# Altium footprint library IC.PcbLib: 220 footprints (part 1 of 14)
Each footprint in its own frame and in the unit in brackets; x right, y up, seen from the top. Pads: shape width x height; smd on the part's side, far side on the other; paste and mask are expansions set on the pad; w line width, h text height; cw(c..) or ccw(c..) is an arc to the next point about the centre after c.
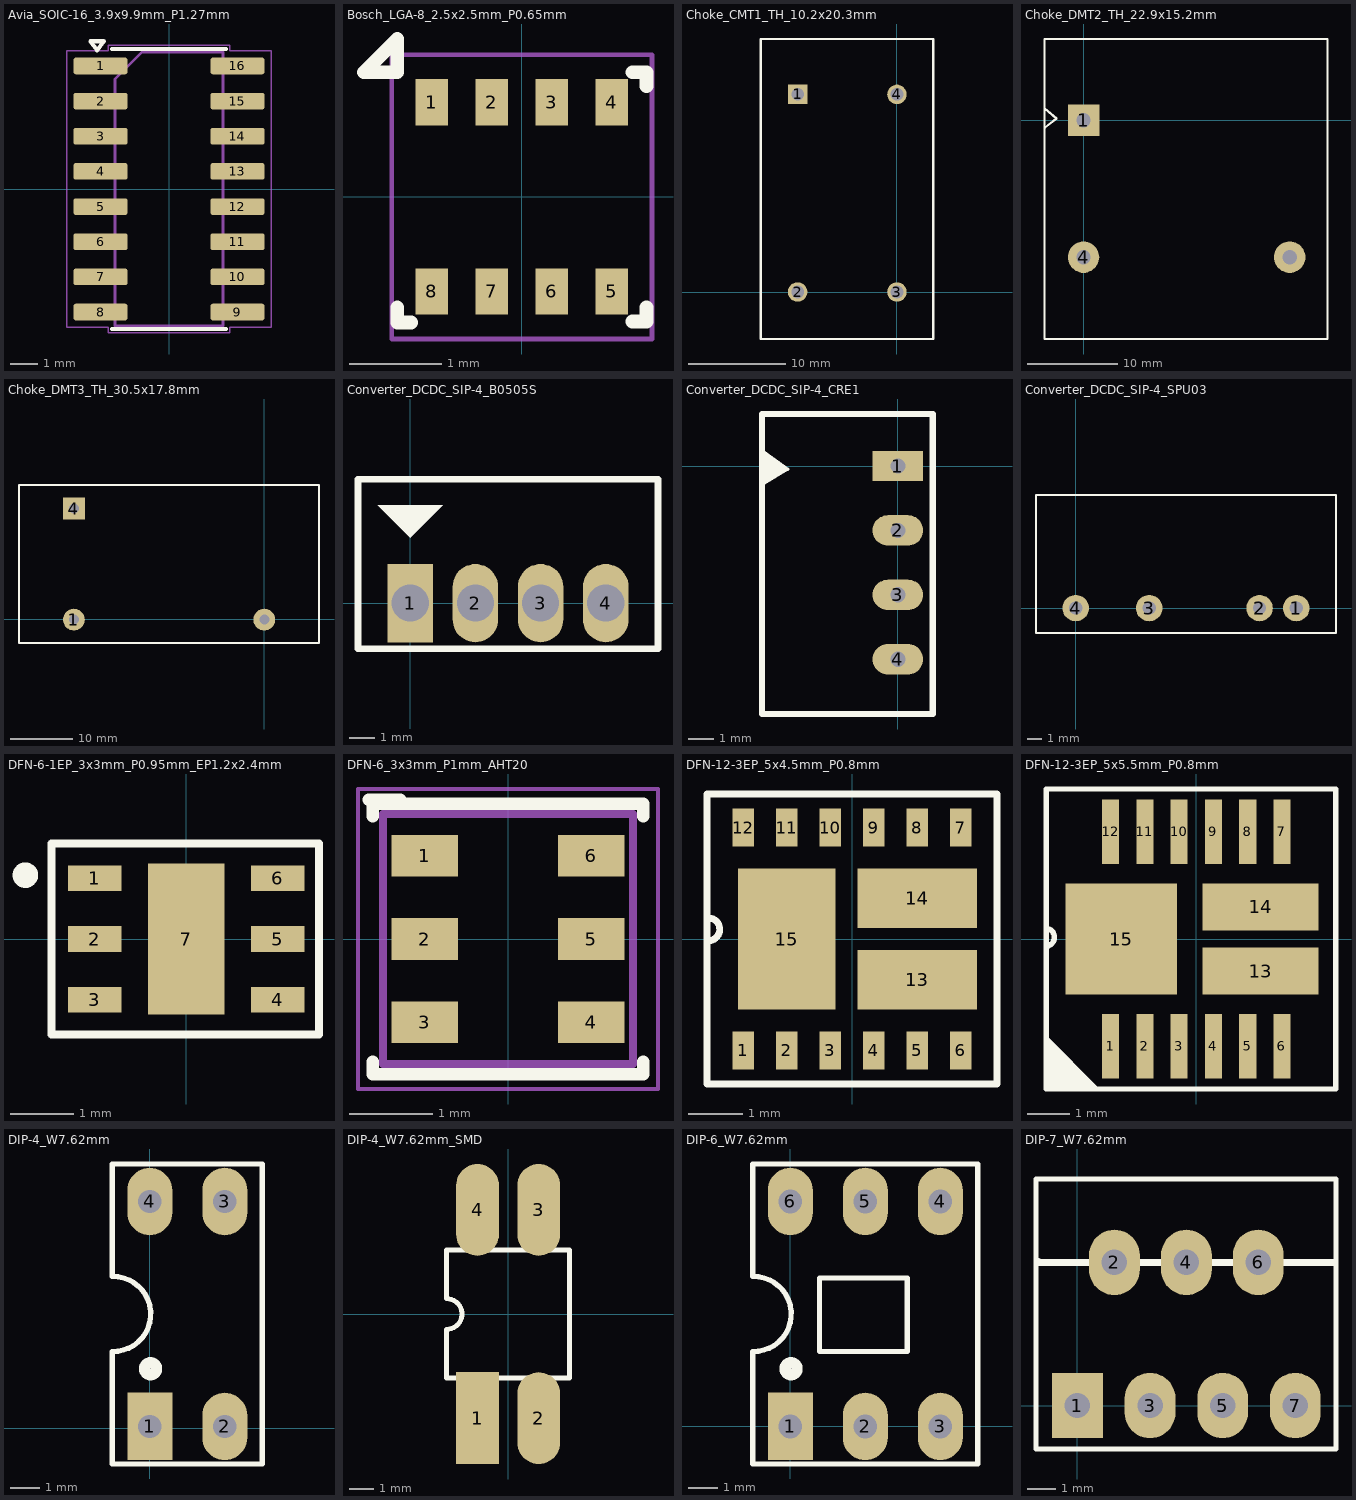
[diagram p0: the footprints below, top view; thin cyan lines are the x and y axes]

## Avia_SOIC-16_3.9x9.9mm_P1.27mm [mm] "HX711, 24-bit ADC for load cells — ADC 24 bit cho cảm biến lực và cân điện tử [ADC 24 bit cho cam bien luc va can dien tu]"
height 1.55
pads (16):
  rrect25% 1.95x0.6 smd: 1(-2.475,4.445) 2(-2.475,3.175) 3(-2.475,1.905) 4(-2.475,0.635) 5(-2.475,-0.635) 6(-2.475,-1.905) 7(-2.475,-3.175) 8(-2.475,-4.445) 9(2.475,-4.445) 10(2.475,-3.175) 11(2.475,-1.905) 12(2.475,-0.635) 13(2.475,0.635) 14(2.475,1.905) 15(2.475,3.175) 16(2.475,4.445)
Top Overlay:
  lines w0.15: -2.06,-5.06 2.06,-5.06 ; -2.06,5.06 2.06,5.06 ; -2.84,5.34 -2.6,5.01 -2.36,5.34 -2.84,5.34
Mechanical 2:
  lines w0.1: -1.95,-4.95 1.95,-4.95 1.95,4.95 -0.975,4.95 -1.95,3.975 -1.95,-4.95
Mechanical 4:
  lines w0.05: -3.7,-5 -3.7,5 -2.2,5 -2.2,5.2 2.2,5.2 2.2,5 3.7,5 3.7,-5 2.2,-5 2.2,-5.2 -2.2,-5.2 -2.2,-5 -3.7,-5
3D body "Avia_SOIC-16_3.9x9.9mm_P1.27mm.step": height 0, standoff 0, extent -3.45,-4.745 3.45,4.745

## Bosch_LGA-8_2.5x2.5mm_P0.65mm [mm] "Bosch 8-pin metal-lid LGA 2.5x2.5mm pressure/humidity sensor (BME280/BMP280)"
height 0.8
pads (8):
  rect 0.35x0.5 smd: 1(-0.975,1.025) 2(-0.325,1.025) 3(0.325,1.025) 4(0.975,1.025) 5(0.975,-1.025) 6(0.325,-1.025) 7(-0.325,-1.025) 8(-0.975,-1.025)
Top Overlay:
  lines w0.15: -1.35,-1.36 -1.2,-1.36 ; -1.35,-1.35 -1.35,-1.2 ; 1.2,-1.35 1.35,-1.35 1.35,-1.2 ; 1.2,1.35 1.35,1.35 1.35,1.2 ; -1.71,1.35 -1.35,1.35 -1.35,1.71 -1.71,1.35
Mechanical 4:
  lines w0.05: -1.41,-1.54 -1.41,1.54 1.41,1.54 1.41,-1.54 -1.41,-1.54
3D body "Bosch_LGA-8_2.5x2.5mm_P0.65mm_ClockwisePinNumbering.step": height 0.8, standoff 0, extent -1.235,-1.285 1.265,1.215

## Choke_CMT1_TH_10.2x20.3mm [mm] "Common-mode choke CMT1 through-hole, 4 pins, span 10.2x20.3mm"
height 33
pads (4):
  rect 2x2 hole 1.3: 1(-10.2,20.3)
  round 2 hole 1.3: 2(-10.2,0) 3(0,0) 4(0,20.3)
Top Overlay:
  lines w0.254: -13.995,-4.826 -13.995,20.195 -13.995,25.984 3.734,25.984 3.734,-4.826 -13.995,-4.826
3D body "Choke_CMT1_TH_10.2x20.3mm.step": height 22.4, standoff -3, extent -12.7,-2.5 2.5,22.8

## Choke_DMT2_TH_22.9x15.2mm [mm] "Differential-mode choke DMT2 through-hole, 3 pins"
height 40.6
pads (3):
  rect 3.5x3.5 hole 1.6: 1(0,0)
  round 3.5 hole 1.6: 4(0,-15.2) ""(22.9,-15.2)
Top Overlay:
  lines w0.254: -4.301,-0.823 -3.006,0.193 -4.301,1.311 ; -0.5,9.032 27.093,9.032 27.093,-24.292 -4.326,-24.292 -4.326,-21.924 -4.326,9.032 0,9.032
3D body "Choke_DMT2_TH_22.9x15.2mm.step": height 16.59, standoff -3, extent -2.278,-21.328 25.178,6.128

## Choke_DMT3_TH_30.5x17.8mm [mm] "Differential-mode choke DMT3 through-hole, 3 pins"
height 48.3
pads (3):
  round 3.5 hole 1.6: 1(-30.5,-0.05) ""(0,-0.05)
  rect 3.5x3.5 hole 1.6: 4(-30.5,17.75)
Top Overlay:
  lines w0.254: 5.736,21.514 -39.294,21.514 -39.294,17.456 -39.294,-3.785 4.035,-3.785 8.763,-3.785 8.763,21.514 5.75,21.514
3D body "Choke_DMT3_TH_30.5x17.8mm.step": height 21.13, standoff -3, extent -32.93,-8.83 2.43,26.53

## Converter_DCDC_SIP-4_B0505S [mil] "Mornsun B0505S 1W isolated DC-DC converter, SIP-4, pitch 2.54mm"
pads (4):
  rect 70x120 hole 57: 1(0,0)
  oval 70x120 hole 57: 2(100,0) 3(200,0) 4(300,0)
Top Overlay:
  region: -50,150 50,150 0,100
  lines w10: -80,-70 -80,-60 -80,190 380,190 380,-70 -80,-70
3D body "B0505s.step": height 393.7, standoff -141.73, extent -76.38,-50 376.38,186.22

## Converter_DCDC_SIP-4_CRE1 [mm] "Murata CRE1 1W isolated DC-DC converter, SIP-4, pitch 2.54mm"
height 10
pads (4):
  rect 2x1.2 hole 0.6: 1(0,0)
  oval 2x1.2 hole 0.6: 2(0,-2.54) 3(0,-5.08) 4(0,-7.62)
Top Overlay:
  region: -5.385,0.584 -5.334,0.533 -5.334,-0.66 -4.928,-0.483 -4.369,-0.102
  lines w0.127: -5.319,0.58 -4.343,-0.127 -5.306,-0.69
  lines w0.254: -5.359,-9.779 -5.359,2.052 1.372,2.052 1.372,-9.779 -5.359,-9.779
3D body "Converter_DCDC_SIP-4_CRE1.step": height 7.8, standoff -3, extent -5.8,-7.87 5.8,0.25

## Converter_DCDC_SIP-4_SPU03 [mm] "Mean Well SPU03 3W isolated DC-DC converter, SIP-4, pitch 5.0mm"
height 10.2
pads (4):
  round 1.8 hole 0.9: 1(15,0) 2(12.5,0) 3(5,0) 4(0,0)
Top Overlay:
  lines w0.127: -2.7,-1.7 17.7,-1.7 17.7,7.7 -2.7,7.7 -2.7,-1.7
3D body "Converter_DCDC_SIP-4_SPU03.step": height 10.5, standoff -3, extent -0.324,-3 15.324,3

## DFN-6-1EP_3x3mm_P0.95mm_EP1.2x2.4mm [mm] "DFN-6 with exposed pad 1.2x2.36mm, body 3x3mm, pitch 0.95mm"
height 0.6
pads (7):
  rect 0.84x0.4 smd mask+0.076: 1(-1.435,0.95) 2(-1.435,0) 3(-1.435,-0.95) 4(1.435,-0.95) 5(1.435,0) 6(1.435,0.95)
  rect 1.2x2.365 smd mask+0.076: 7(0,0)
Top Overlay:
  circle w0.2: c-2.52,1 r0.1
  lines w0.127: 1.435,1.5 2.081,1.5 2.083,1.499 2.083,-1.499 2.081,-1.5 1.5,-1.5 -1.5,-1.5 -2.108,-1.5 -2.108,1.5 -1.5,1.5 1.5,1.5
Top Paste:
  region: -0.57,0.83 0.57,0.83 0.57,-0.83 -0.57,-0.83
3D body "User Library-DFN6-3x3x0_80.step": height 0.85, standoff 0.05, extent -1.5,-1.5 1.5,1.5

## DFN-6_3x3mm_P1mm_AHT20 [mm] "AHT20, Digital humidity and temperature sensor, I2C — Cảm biến nhiệt độ và độ ẩm số qua I2C [Cam bien nhiet do va do am so qua I2C]"
height 1
pads (6):
  rect 0.8x0.5 smd mask+0.065: 1(-1,1) 2(-1,0) 3(-1,-1) 4(1,-1) 5(1,0) 6(1,1)
Top Overlay:
  lines w0.15: -1.67,1.67 -1.29,1.67 ; -1.62,-1.475 -1.62,-1.62 1.62,-1.62 1.62,-1.475 ; -1.62,1.475 -1.62,1.62 1.62,1.62 1.62,1.475
Mechanical 2:
  lines w0.1: -1.5,-1.5 1.5,-1.5 1.5,1.5 -1.5,1.5 -1.5,-1.5
Mechanical 4:
  lines w0.05: -1.8,-1.8 1.8,-1.8 1.8,1.8 -1.8,1.8 -1.8,-1.8
3D body "DFN-6_3x3mm_P1mm_AHT20.step": height 0, standoff 0, extent -1.4,-1.25 1.4,1.25

## DFN-12-3EP_5x4.5mm_P0.8mm [mm] "DFN-12 (5.0x4.5mm) with 3 exposed pads, pitch 0.8mm"
height 0.8
pads (15):
  rect 0.4x0.7 smd: 1(-2,-2.05) 2(-1.2,-2.05) 3(-0.4,-2.05) 4(0.4,-2.05) 5(1.2,-2.05) 6(2,-2.05) 7(2,2.05) 8(1.2,2.05) 9(0.4,2.05) 10(-0.4,2.05) 11(-1.2,2.05) 12(-2,2.05)
  rect 2.2x1.1 smd: 13(1.2,-0.75) 14(1.2,0.75)
  rect 1.8x2.6 smd: 15(-1.2,0)
Top Overlay:
  lines w0.127: -2.623,0.386 cw(c-2.642,0.178) -2.601,-0.028 ; -2.667,-2.667 2.667,-2.667 2.667,2.667 -2.667,2.667 -2.667,-2.667
3D body "DMHT6016LFJ-13.stp": height 0.9, standoff 0, extent -2.5,-2.36 2.5,2.36

## DFN-12-3EP_5x5.5mm_P0.8mm [mm] "DFN-12 variant with wider span (4.0x5.0mm) and 3 exposed pads, pitch 0.8mm"
height 0.8
pads (15):
  rect 0.4x1.5 smd: 1(-2,-2.5) 2(-1.2,-2.5) 3(-0.4,-2.5) 4(0.4,-2.5) 5(1.2,-2.5) 6(2,-2.5) 7(2,2.5) 8(1.2,2.5) 9(0.4,2.5) 10(-0.4,2.5) 11(-1.2,2.5) 12(-2,2.5)
  rect 2.7x1.1 smd: 13(1.5,-0.75) 14(1.5,0.75)
  rect 2.6x2.6 smd: 15(-1.75,0)
Top Overlay:
  region: -3.5,-2.25 -2.25,-3.5 -3.5,-3.5
  lines w0.127: -3.5,0.25 cw(c-3.519,0.041) -3.478,-0.164 ; -3.5,-3.5 3.25,-3.5 3.25,3.5 -3.5,3.5 -3.5,-3.5
3D body "DMHT6016LFJ-13.stp": height 0.9, standoff 0, extent -2.5,-2.36 2.5,2.36

## DIP-4_W7.62mm [mil] "DIP-4, pitch 2.54mm, row spacing 7.62mm (300mil)"
height 220.08
pads (4):
  rect 60x90 hole 31: 1(0,2.52)
  oval 60x90 hole 31: 2(100,2.52) 3(100,302.52) 4(0,302.52)
Top Overlay:
  circle w15: c1,79.52 r8
  lines w7: -50.38,102.57 ccw(c-48.68,152.54) -50,202.52 ; -50,102.52 -50,-47.48 150,-47.48 150,352.52 -50,352.52 -50,203.52
3D body "SW3DPS-DIP4-DEFAULT.STEP": height 169.69, standoff -129.13, extent -59.05,-7.48 159.06,307.48

## DIP-4_W7.62mm_SMD [mil] "DIP-4 SMD gull-wing, pitch 2.54mm, row spacing 7.62mm"
height 179.92
pads (4):
  rect 70x150 smd: 1(-50,-170)
  oval 70x150 smd: 2(50,-170) 3(50,170) 4(-50,170)
Top Overlay:
  lines w7.87: -100.39,-104.33 100.39,-104.33 100.39,104.33 -100.39,104.33 -100.39,25 cw(c-100.39,0) -100.39,-25 -100.39,-104.33
3D body "DIP 4 SMD.step": height 181.77, standoff 0.6, extent -98.39,-209.9 102.39,201.91

## DIP-6_W7.62mm [mil] "DIP-6, pitch 2.54mm, row spacing 7.62mm (300mil)"
height 100
pads (6):
  rect 60x90 hole 31.5: 1(0,0)
  oval 60x90 hole 31.5: 2(100,0) 3(200,0) 4(200,300) 5(100,300) 6(0,300)
Top Overlay:
  circle w15: c1,77 r8
  lines w7: -50.38,100.05 ccw(c-48.69,150.02) -50,200 ; -50,100 -50,-50 250,-50 250,350 -50,350 -50,201 ; 39,100 156,100 156,198 39,198 39,100
3D body "SW3DPS-DIP6-DEFAULT.STEP": height 169.69, standoff -129.13, extent -58.11,-7.48 260,307.48

## DIP-7_W7.62mm [mil] "DIP-7 (8-pin minus 1), pitch 2.54mm, row spacing 7.62mm"
pads (7):
  rect 70x90 hole 35: 1(0,0)
  oval 70x90 hole 35: 2(51,197) 3(100,0) 4(150,197) 5(200,0) 6(249,197) 7(300,0)
Top Overlay:
  lines w7: -57,-60 356,-60 356,312 -57,312 -57,-60
  lines w10: -54,198 -54,197 354,197
3D body "User Library-TO-220(T).STEP": height 756.77, standoff -77.87, extent -50.57,-11.02 351,311.02